# Altium footprint library SG_PCB_Fomin.PcbLib: 74 footprints (part 1 of 5)
Each footprint in its own frame and in the unit in brackets; x right, y up, seen from the top. Pads: shape width x height; smd on the part's side, far side on the other; paste and mask are expansions set on the pad; w line width, h text height; cw(c..) or ccw(c..) is an arc to the next point about the centre after c.
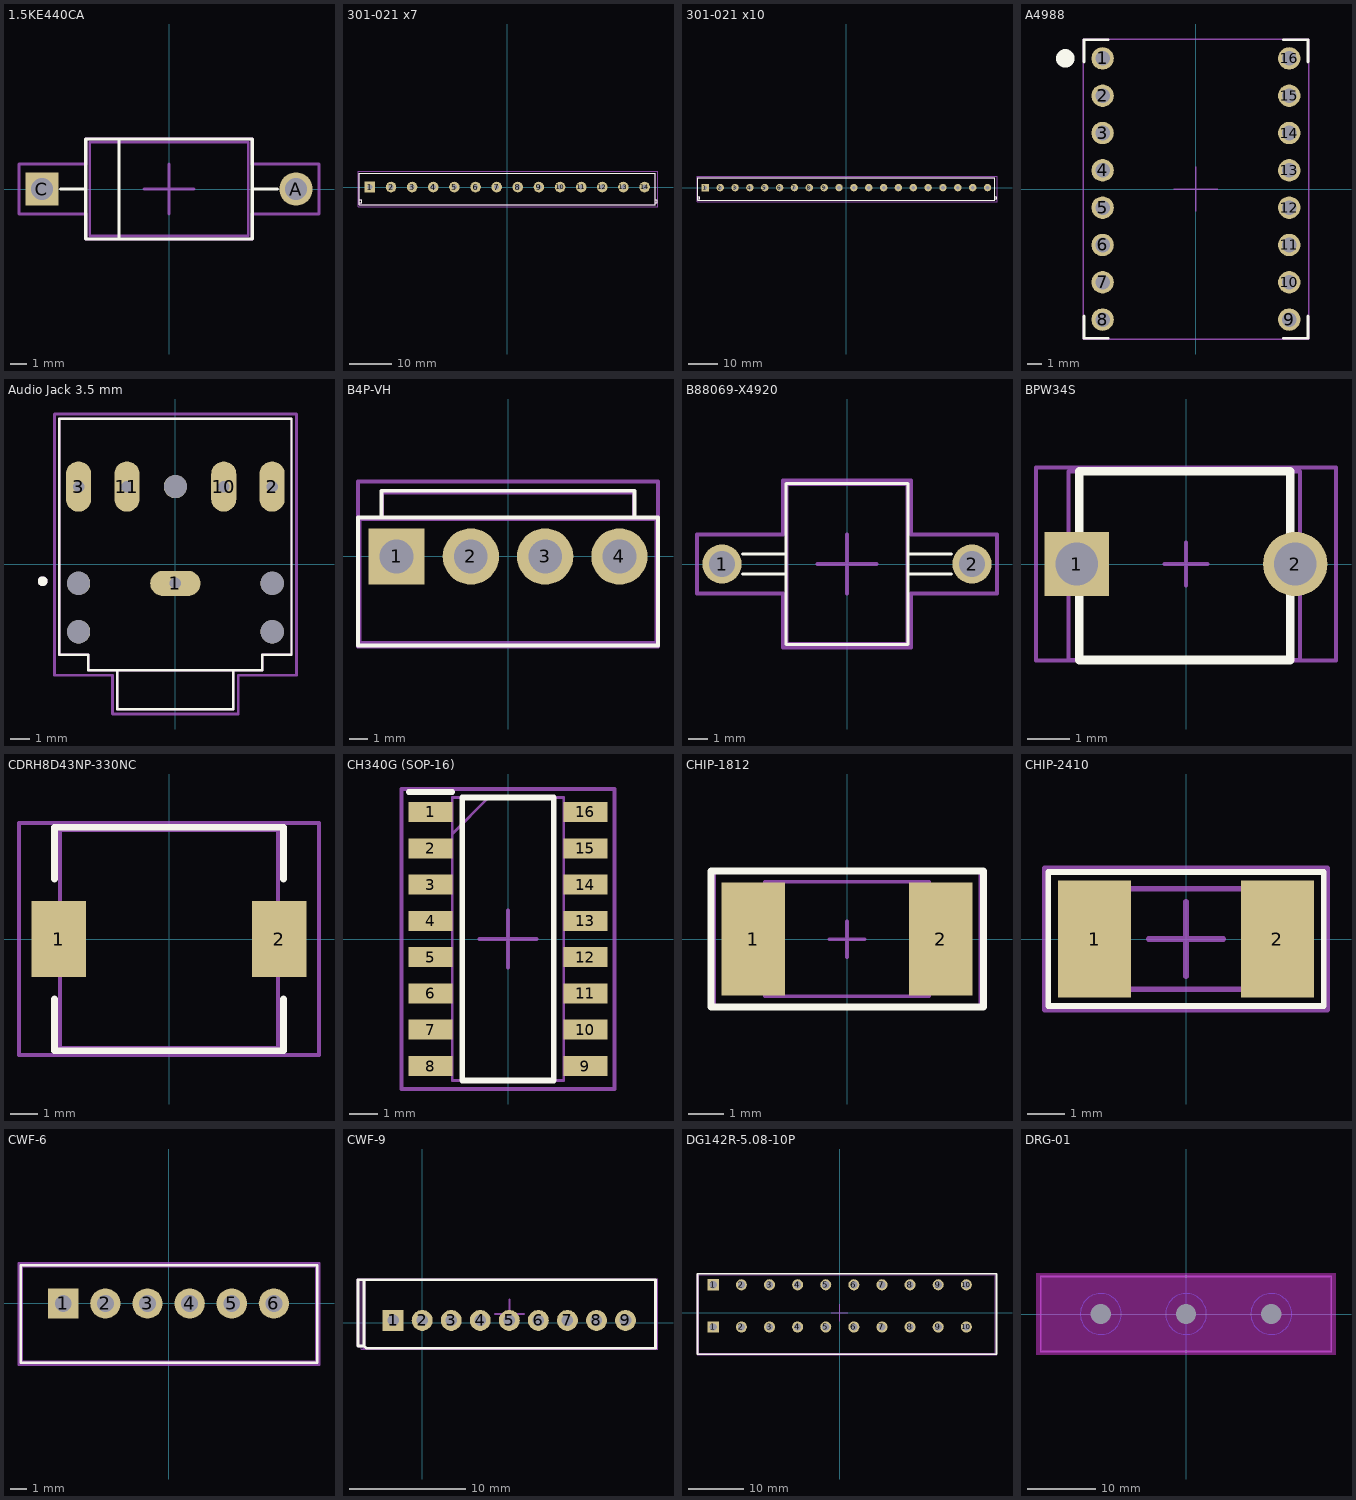
[diagram p0: the footprints below, top view; thin cyan lines are the x and y axes]

## 1.5KE440CA [mm] "TVS Diode 440V"
pads (2):
  round 2 hole 1.3: A(7.62,0)
  rect 2x2 hole 1.3: C(-7.62,0)
Top Overlay:
  lines w0.2: -6.5,0 -5,0 ; -3,-3 -3,3 ; 5,0 6.5,0 ; -5,-3 5,-3 5,3 -5,3 -5,-3
Top Assembly:
  lines w0.15: -4.75,-2.8 4.75,-2.8 4.75,2.8 -4.75,2.8 -4.75,-2.8
Top Courtyard:
  lines w0.2: -1.5,0 1.5,0 ; 0,-1.5 0,1.5 ; -9,-1.5 -9,1.5 -5,1.5 -5,3 5,3 5,1.5 9,1.5 9,-1.5 5,-1.5 5,-3 -5,-3 -5,-1.5 -9,-1.5
Top Designator:
  text ".Designator" at -7.746,-0.738 h1.52

## 301-021 x7 [mm] "301-021 Клеммник"
pads (14):
  rect 2.5x2.5 hole 1.2: 1(-32.5,0)
  round 2.5 hole 1.2: 2(-27.5,0) 3(-22.5,0) 4(-17.5,0) 5(-12.5,0) 6(-7.5,0) 7(-2.5,0) 8(2.5,0) 9(7.5,0) 10(12.5,0) 11(17.5,0) 12(22.5,0) 13(27.5,0) 14(32.5,0)
Top Overlay:
  lines w0.254: -34.892,-3.772 -34.384,-3.772 -34.384,-3.01 -34.892,-3.01 ; 35.014,-3.772 35.522,-3.772 35.522,-3.01 35.014,-3.01 ; -35,-4.2 -25,-4.2 -15,-4.2 -5,-4.2 5,-4.2 15,-4.2 25,-4.2 35,-4.2 35,3.3 25,3.3 15,3.3 5,3.3 -5,3.3 -15,3.3 -25,3.3 -35,3.3 -35,-4.2
Top Assembly:
  lines w0.254: -34.892,-3.772 -34.384,-3.772 -34.384,-3.01 -34.892,-3.01 ; 35.014,-3.772 35.522,-3.772 35.522,-3.01 35.014,-3.01 ; -35,-4.2 -35,3.3 -25,3.3 -15,3.3 -5,3.3 5,3.3 15,3.3 25,3.3 35,3.3 35,-4.2 25,-4.2 15,-4.2 5,-4.2 -5,-4.2 -15,-4.2 -25,-4.2 -35,-4.2
Top Courtyard:
  lines w0.2: -25.312,-4.716 -14.312,-4.716 ; -25.312,3.784 -14.312,3.784 ; -24.312,-4.716 -35.312,-4.716 -35.312,3.784 -24.312,3.784 ; -15.312,-4.716 -4.312,-4.716 ; -15.312,3.784 -4.312,3.784 ; -5.312,-4.716 5.688,-4.716 ; -5.312,3.784 5.688,3.784 ; 4.688,-4.716 15.688,-4.716 ; 4.688,3.784 15.688,3.784 ; 14.688,-4.716 25.688,-4.716 ; 14.688,3.784 25.688,3.784 ; 24.688,-4.716 35.688,-4.716 35.688,3.784 24.688,3.784
3D body "301-021.stp": height 10, standoff -3.46, extent 25.1,-4.1 35.6,3.5
3D body "301-021.stp": height 10, standoff -3.46, extent 15.1,-4.1 25.6,3.5
3D body "301-021.stp": height 10, standoff -3.46, extent 5.1,-4.1 15.6,3.5
3D body "301-021.stp": height 10, standoff -3.46, extent -34.9,-4.1 -24.4,3.5
3D body "301-021.stp": height 10, standoff -3.46, extent -4.9,-4.1 5.6,3.5
3D body "301-021.stp": height 10, standoff -3.46, extent -14.9,-4.1 -4.4,3.5
3D body "301-021.stp": height 10, standoff -3.46, extent -24.9,-4.1 -14.4,3.5

## 301-021 x10 [mm] "301-021 Клеммник"
pads (20):
  rect 2.5x2.5 hole 1.2: 1(-47.5,0)
  round 2.5 hole 1.2: 2(-42.5,0) 3(-37.5,0) 4(-32.5,0) 5(-27.5,0) 6(-22.5,0) 7(-17.5,0) 8(-12.5,0) 9(-7.5,0) 10(-2.5,0) 11(2.5,0) 12(7.5,0) 13(12.5,0) 14(17.5,0) 15(22.5,0) 16(27.5,0) 17(32.5,0) 18(37.5,0) 19(42.5,0) 20(47.5,0)
Top Overlay:
  lines w0.254: -49.892,-3.772 -49.384,-3.772 -49.384,-3.01 -49.892,-3.01 ; 50.014,-3.772 50.522,-3.772 50.522,-3.01 50.014,-3.01 ; -50,-4.2 -40,-4.2 -30,-4.2 -20,-4.2 -10,-4.2 0,-4.2 10,-4.2 20,-4.2 30,-4.2 40,-4.2 50,-4.2 50,3.3 40,3.3 30,3.3 20,3.3 10,3.3 0,3.3 -10,3.3 -20,3.3 -30,3.3 -40,3.3 -50,3.3 -50,-4.2
Top Assembly:
  lines w0.254: -49.892,-3.772 -49.384,-3.772 -49.384,-3.01 -49.892,-3.01 ; 50.014,-3.772 50.522,-3.772 50.522,-3.01 50.014,-3.01 ; -50,-4.2 -50,3.3 -40,3.3 -30,3.3 -20,3.3 -10,3.3 0,3.3 10,3.3 20,3.3 30,3.3 40,3.3 50,3.3 50,-4.2 40,-4.2 30,-4.2 20,-4.2 10,-4.2 0,-4.2 -10,-4.2 -20,-4.2 -30,-4.2 -40,-4.2 -50,-4.2
Top Courtyard:
  lines w0.2: -40.312,-4.716 -29.312,-4.716 ; -40.312,3.784 -29.312,3.784 ; -39.312,-4.716 -50.312,-4.716 -50.312,3.784 -39.312,3.784 ; -30.312,-4.716 -19.312,-4.716 ; -30.312,3.784 -19.312,3.784 ; -20.312,-4.716 -9.312,-4.716 ; -20.312,3.784 -9.312,3.784 ; -10.312,-4.716 0.688,-4.716 ; -10.312,3.784 0.688,3.784 ; -0.312,-4.716 10.688,-4.716 ; -0.312,3.784 10.688,3.784 ; 9.688,-4.716 20.688,-4.716 ; 9.688,3.784 20.688,3.784 ; 19.688,-4.716 30.688,-4.716 ; 19.688,3.784 30.688,3.784 ; 29.688,-4.716 40.688,-4.716 ; 29.688,3.784 40.688,3.784 ; 39.688,-4.716 50.688,-4.716 50.688,3.784 39.688,3.784
3D body "301-021.stp": height 10, standoff -3.46, extent 10.1,-4.1 20.6,3.5
3D body "301-021.stp": height 10, standoff -3.46, extent 0.1,-4.1 10.6,3.5
3D body "301-021.stp": height 10, standoff -3.46, extent -9.9,-4.1 0.6,3.5
3D body "301-021.stp": height 10, standoff -3.46, extent 40.1,-4.1 50.6,3.5
3D body "301-021.stp": height 10, standoff -3.46, extent 30.1,-4.1 40.6,3.5
3D body "301-021.stp": height 10, standoff -3.46, extent 20.1,-4.1 30.6,3.5
3D body "301-021.stp": height 10, standoff -3.46, extent -49.9,-4.1 -39.4,3.5
3D body "301-021.stp": height 10, standoff -3.46, extent -19.9,-4.1 -9.4,3.5
3D body "301-021.stp": height 10, standoff -3.46, extent -29.9,-4.1 -19.4,3.5
3D body "301-021.stp": height 10, standoff -3.46, extent -39.9,-4.1 -29.4,3.5

## A4988 [mil] "STEPPER DRIVER"
pads (16):
  round 60 hole 39.37: 1(-250,350) 2(-250,250) 3(-250,150) 4(-250,50) 5(-250,-50) 6(-250,-150) 7(-250,-250) 8(-250,-350) 9(250,-350) 10(250,-250) 11(250,-150) 12(250,-50) 13(250,50) 14(250,150) 15(250,250) 16(250,350)
Top Overlay:
  circle w39.37: c-350,350 r5
  lines w7.87: -300,-340 -300,-400 -235,-400 ; -300,340 -300,400 -235,400 ; 235,-400 300,-400 300,-340 ; 235,400 300,400 300,340
Top Assembly:
  lines w3.94: -301.97,-401.97 301.97,-401.97 301.97,401.97 -301.97,401.97 -301.97,-401.97
Top Courtyard:
  lines w3.94: -59.06,0 59.06,0 ; 0,-59.06 0,59.06 ; -301.97,-401.97 301.97,-401.97 301.97,401.97 -301.97,401.97 -301.97,-401.97
Top Designator:
  text ".Designator" at -295.12,-19.22 h60
3D body "a4988-stepper-motor-driver-carrier.step": height 132.68, standoff 0, extent -300,-400 300,400

## Audio Jack 3.5 mm [mm]
pads (10):
  oval 2.6x1.3 hole 0.6 square: 1(0,-1)
  oval 1.3x2.6 hole 0.6 square: 2(5,4) 3(-5,4) 10(2.5,4) 11(-2.5,4)
  round 1.2 hole 1.2 unplated: ""(-5,-3.5) ""(-5,-1) ""(0,4) ""(5,-3.5) ""(5,-1)
Top Overlay:
  circle w0.305: c-6.858,-0.89 r0.1
  lines w0.127: -3,-5.5 -4.5,-5.5 -4.5,-4.7 -6,-4.7 -6,7.5 6,7.5 6,-4.7 4.5,-4.7 4.5,-5.5 3,-5.5 ; -3,-5.5 3,-5.5 ; -3,-5.5 -3,-7.5 3,-7.5 3,-5.5
Top Assembly:
  circle w0.305: c-6.858,-0.89 r0.1
  lines w0.127: -3,-5.5 -4.5,-5.5 -4.5,-4.7 -6,-4.7 -6,7.5 6,7.5 6,-4.7 4.5,-4.7 4.5,-5.5 3,-5.5 ; -3,-5.5 3,-5.5 ; -3,-5.5 -3,-7.5 3,-7.5 3,-5.5
Top Courtyard:
  lines w0.15: -6.25,-5.75 -3.25,-5.75 -3.25,-7.75 3.25,-7.75 3.25,-5.75 6.25,-5.75 6.25,7.75 -6.25,7.75 -6.25,-5.75
Top Designator:
  text ".Designator" at -7.246,-0.238 h1.52
3D body "35RAPC4BHN2--3DModel-STEP-1.STEP": height 6, standoff -2, extent -6,-7.5 6,7.5

## B4P-VH [mm] "Connector"
pads (4):
  rect 3x3 hole 1.8: 1(-5.94,0)
  round 3 hole 1.8: 2(-1.98,0) 3(1.98,0) 4(5.94,0)
Top Overlay:
  lines w0.2: -6.75,2.102 -6.75,3.5 6.75,3.5 6.75,2.111 ; -8,-4.75 -8,2.084 8,2.084 8,-4.75 -8,-4.75
Top Assembly:
  lines w0.2: -6.75,2 -6.7,2 ; -6.7,2 -6.7,3.4 6.7,3.4 6.7,2 -6.7,2 ; -7.9,-4.6 -7.9,2 7.9,2 7.9,-4.6 -7.9,-4.6
Top Courtyard:
  lines w0.2: -8,-4.8 -8,4 8,4 8,3.4 8,-4.8 -8,-4.8
Top Designator:
  text ".Designator" at -4.998,-0.333 h1
3D body "User Library-B4P-VH.STEP": height 10.9, standoff -3.7, extent -7.89,-4.6 7.89,3.9

## B88069-X4920 [mm] "Spark gap"
pads (2):
  round 2 hole 1.3: 1(-6.35,0) 2(6.35,0)
Top Overlay:
  lines w0.15: -5.3,-0.5 -3.1,-0.5 ; -5.3,0.5 -3.1,0.5 ; 3.1,-0.5 5.3,-0.5 ; 3.1,0.5 5.3,0.5 ; -3.1,-4.1 3.1,-4.1 3.1,4.1 -3.1,4.1 -3.1,-4.1
Top Assembly:
  lines w0.15: -3.05,-4.05 3.05,-4.05 3.05,4.05 -3.05,4.05 -3.05,-4.05
Top Courtyard:
  lines w0.2: -1.5,0 1.5,0 ; 0,-1.5 0,1.5 ; -7.62,-1.5 -7.62,1.5 -3.25,1.5 -3.25,4.25 3.25,4.25 3.25,1.5 7.62,1.5 7.62,-1.5 3.25,-1.5 3.25,-4.25 -3.25,-4.25 -3.25,-1.5 -7.62,-1.5
Top Designator:
  text ".Designator" at -7.346,-0.438 h1.52

## BPW34S [mm] "Photodiode"
pads (2):
  rect 1.5x1.5 hole 1 unplated: 1(-2.55,0)
  round 1.5 hole 1 unplated: 2(2.55,0)
Top Overlay:
  lines w0.2: -2.49,-2.24 -2.49,2.16 2.428,2.16 2.428,-2.24 -2.49,-2.24
Top Assembly:
  lines w0.1: -2.741,-2.24 -2.741,2.16 2.659,2.16 2.659,-2.24 -2.741,-2.24
Top Courtyard:
  lines w0.1: -0.5,0 0.5,0 ; 0,-0.5 0,0.5 ; -3.5,-2.25 3.5,-2.25 3.5,2.25 -3.5,2.25 -3.5,-2.25
3D body "User Library-bpw34.STEP": height 1.54, standoff -3.66, extent -2.741,-2.24 2.659,2.16

## CDRH8D43NP-330NC [mm] "Inductor 8.3*8.3*4.5, 33uH 1.3A"
pads (2):
  rect 2x2.8 smd: 1(-4.05,0) 2(4.05,0)
Top Overlay:
  lines w0.25: -4.2,-2.2 -4.2,-4.1 4.2,-4.1 4.2,-2.2 ; -4.2,2.2 -4.2,4.1 4.2,4.1 4.2,2.2
Top Assembly:
  lines w0.15: -4,-4 4,-4 4,4 -4,4 -4,-4
Top Courtyard:
  lines w0.15: -5.5,-4.25 5.5,-4.25 5.5,4.25 -5.5,4.25 -5.5,-4.25
Top Designator:
  text ".Designator" at -3.9,-0.233 h0.8

## CH340G (SOP-16) [mm]
pads (16):
  rect 1.525x0.7 smd: 1(-2.712,4.445) 2(-2.712,3.175) 3(-2.712,1.905) 4(-2.712,0.635) 5(-2.712,-0.635) 6(-2.712,-1.905) 7(-2.712,-3.175) 8(-2.712,-4.445) 9(2.712,-4.445) 10(2.712,-3.175) 11(2.712,-1.905) 12(2.712,-0.635) 13(2.712,0.635) 14(2.712,1.905) 15(2.712,3.175) 16(2.712,4.445)
Top Overlay:
  lines w0.2: -3.475,5.145 -1.95,5.145 ; -1.6,-4.95 -1.6,4.95 1.6,4.95 1.6,-4.95 -1.6,-4.95
Top Assembly:
  lines w0.1: -1.95,3.68 -0.68,4.95 ; -1.95,-4.95 -1.95,4.95 1.95,4.95 1.95,-4.95 -1.95,-4.95
Top Courtyard:
  lines w0.15: -1,0 1,0 ; 0,-1 0,1 ; -3.725,-5.25 -3.725,5.25 3.725,5.25 3.725,-5.25 -3.725,-5.25
3D body "AC6919A-SOP16.stp": height 1.75, standoff 0, extent -3,-4.95 3,4.95

## CHIP-1812 [mm]
height 0.55
pads (2):
  rect 1.78x3.15 smd: 1(-2.615,0) 2(2.615,0)
Top Overlay:
  lines w0.2: -3.8,-1.9 3.813,-1.9 3.813,1.905 -3.8,1.905 -3.8,-1.9
Top Assembly:
  lines w0.1: -2.3,-1.6 2.3,-1.6 2.3,1.6 -2.3,1.6 -2.3,-1.6
Top Courtyard:
  lines w0.05: -3.69,-1.9 3.7,-1.9 3.7,1.9 -3.69,1.9 -3.69,-1.9
  lines w0.1: -0.5,0 0.5,0 ; 0,-0.5 0,0.5
Top Designator:
  text ".Designator" at -4.998,-0.333 h1
3D body "User Library-1812.step": height 0.28, standoff -0.28, extent -2.25,-1.6 2.25,1.6

## CHIP-2410 [mm]
pads (2):
  rect 1.96x3.15 smd: 1(-2.455,0) 2(2.455,0)
Top Overlay:
  lines w0.15: -3.7,-1.8 3.7,-1.8 3.7,0.6 3.7,1.8 -3.7,1.8 -3.7,-1.8
Top Assembly:
  lines w0.15: -3.05,-1.345 -3.05,1.345 3.05,1.345 3.05,-1.345 -3.05,-1.345
Top Courtyard:
  lines w0.15: -1,0 1,0 ; 0,-1 0,1 ; -3.8,-1.9 -3.8,1.9 3.8,1.9 3.8,-1.9 -3.8,-1.9
Top Designator:
  text ".Designator" at -3.9,-0.333 h0.8
3D body "User Library-0452 series fuse.STEP": height 2.69, standoff 0, extent -3.05,-1.345 3.05,1.345

## CWF-6 [mm] "Hole Connector"
pads (6):
  rect 1.8x1.8 hole 1: 1(-6.25,0)
  round 1.8 hole 1: 2(-3.75,0) 3(-1.25,0) 4(1.25,0) 5(3.75,0) 6(6.25,0)
Top Overlay:
  lines w0.15: -8.775,-3.525 -8.775,2.275 8.825,2.275 8.825,-3.525 -8.775,-3.525
Top Assembly:
  lines w0.2: -8.725,-3.475 8.775,-3.475 8.775,2.225 -8.725,2.225 -8.725,-3.475
Top Courtyard:
  lines w0.15: -8.875,-3.625 -8.875,2.375 8.925,2.375 8.925,-3.625 -8.875,-3.625
Top Designator:
  text ".Designator" at -6.946,-1.063 h1.52
3D body "User Library-CWF-6.STEP": height 7, standoff -3.5, extent -8.75,-3.55 8.75,2.2

## CWF-9 [mm]
pads (9):
  rect 1.8x1.8 hole 1: 1(-2.5,0.2)
  round 1.8 hole 1: 2(0,0.2) 3(2.5,0.2) 4(5,0.2) 5(7.5,0.2) 6(10,0.2) 7(12.5,0.2) 8(15,0.2) 9(17.5,0.2)
Top Overlay:
  lines w0.254: -5,-2 -4.8,-2.2 20.1,-2.2 20.1,3.7 -5,3.7 ; -5,-2 -5,3.7 ; -5,-2 -5.525,-2 -5.525,3.7 -5,3.7
Top Assembly:
  lines w0.254: -5,-2 -5.525,-2 -5.525,3.7 -5,3.7 ; -5,3.7 20.1,3.7 20.1,-2.2 -5,-2.2 -5,3.7
Top Courtyard:
  lines w0.1: -5.25,-2.3 -5.25,3.8 20.3,3.8 20.3,-2.3 -5.25,-2.3
  lines w0.15: 6.265,0.75 7.525,0.75 ; 7.525,-0.51 7.525,0.75 ; 7.525,2.01 7.525,0.75 ; 8.785,0.75 7.525,0.75
Top Designator:
  text ".Designator" at 2.154,-0.138 h1.52
3D body "User Library-BxB-XH_mod.step": height 7, standoff -3.3, extent -4.944,-2.143 19.956,3.607

## DG142R-5.08-10P [mm] "Connector"
pads (20):
  rect 2x2 hole 1.3 unplated: 1(-22.86,-2.54) 1(-22.86,5.08)
  round 2 hole 1.3 unplated: 2(-17.78,-2.54) 2(-17.78,5.08) 3(-12.7,-2.54) 3(-12.7,5.08) 4(-7.62,-2.54) 4(-7.62,5.08) 5(-2.54,-2.54) 5(-2.54,5.08) 6(2.54,-2.54) 6(2.54,5.08) 7(7.62,-2.54) 7(7.62,5.08) 8(12.7,-2.54) 8(12.7,5.08) 9(17.78,-2.54) 9(17.78,5.08) 10(22.86,-2.54) 10(22.86,5.08)
Top Overlay:
  lines w0.3: -25.7,-7.5 28.3,-7.5 28.3,7.1 -25.7,7.1 -25.7,-7.5
Top Assembly:
  lines w0.15: -25.525,-7.275 28.075,-7.275 28.075,6.925 -25.525,6.925 -25.525,-7.275
Top Courtyard:
  lines w0.15: -1.525,0.025 1.475,0.025 ; -0.025,-1.475 -0.025,1.525 ; -25.8,-7.6 28.4,-7.6 28.4,7.2 -25.8,7.2 -25.8,-7.6
Top Designator:
  text ".Designator" at -3.8,-0.283 h0.8
3D body "User Library-DG142R-10-5_08.step": height 13.22, standoff -3.47, extent -25.395,-7.17 27.945,6.83

## DRG-01 [mm] "DIN RAIL MOUNT"
pads (3):
  round 0 hole 3 unplated: 0(-12.5,0) 0(0,0) 0(12.5,0)
Top Layer keep-out:
  rectangle: -22,-6 22,6
Bottom Layer keep-out:
  circle w0.1: c0,0 r3
  circle w0.1: c-12.5,0 r3
  circle w0.1: c12.5,0 r3
Top Courtyard:
  lines w0.25: -21.3,-5.5 21.3,-5.5 21.3,5.5 -21.3,5.5 -21.3,-5.5